# Altium footprint library My_PCB_6_28.PcbLib: 151 footprints (part 8 of 10)
Each footprint in its own frame and in the unit in brackets; x right, y up, seen from the top. Pads: shape width x height; smd on the part's side, far side on the other; paste and mask are expansions set on the pad; w line width, h text height; cw(c..) or ccw(c..) is an arc to the next point about the centre after c.
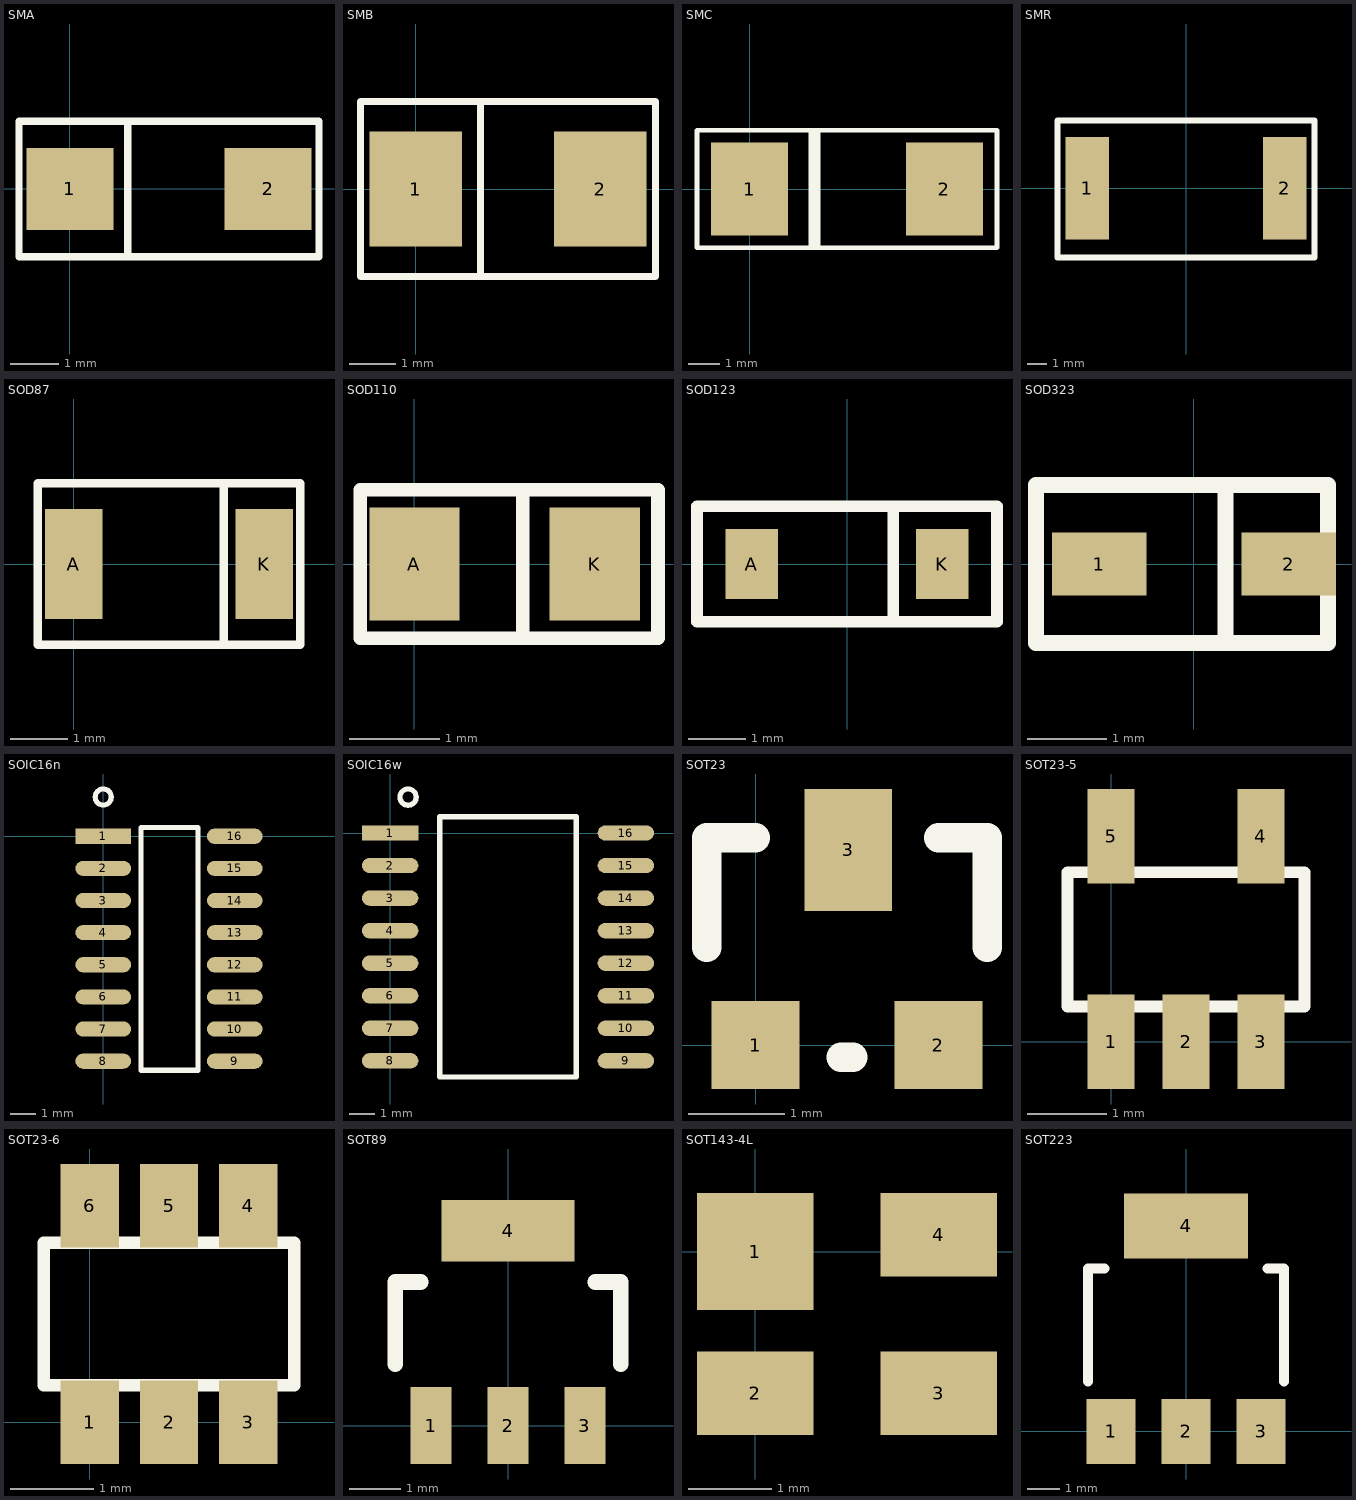
[diagram p7: the footprints below, top view; thin cyan lines are the x and y axes]

## SMA [mm]
height 7
pads (2):
  rect 1.8x1.7 smd: 1(0,0) 2(4.1,0)
Top Overlay:
  lines w0.15: 1.2,-1.4 1.2,1.4 ; -1.05,-1.4 5.15,-1.4 5.15,1.4 -1.05,1.4 -1.05,-1.4
3D body: height 1.85, standoff 0.01, extent -0.335,-0.902 4.46,0.902

## SMB [mm]
height 7
pads (2):
  rect 2x2.5 smd: 1(0,0) 2(4,0)
Top Overlay:
  lines w0.15: 1.4,-1.8 1.4,1.8 ; -1.2,-1.9 -1.2,1.9 5.2,1.9 5.2,-1.9 -1.2,-1.9
3D body: height 2.16, standoff 0.01, extent -0.492,-1.498 4.507,1.499

## SMC [mm]
height 7
pads (2):
  rect 2.5x3 smd: 1(0,0) 2(6.3,0)
Top Overlay:
  lines w0.15: -1.7,-1.9 -1.7,1.9 8,1.9 8,-1.9 -1.7,-1.9
  lines w0.2: 2,-1.85 2,1.85 ; 2.2,-1.85 2.2,1.85
3D body: height 2.84, standoff 0.01, extent -0.654,-1.756 6.943,1.756

## SMR [mm]
height 8
pads (2):
  rect 2.2x5.2 smd: 1(-5,0) 2(5,0)
Top Overlay:
  lines w0.305: -6.5,-3.5 6.5,-3.5 ; -6.5,-3.429 -6.5,3.429 6.5,3.429 ; 6.5,-3.43 6.5,3.43
3D body: height 3.96, standoff 0.01, extent -4.498,-2.3 4.498,2.353

## SOD87 [mm]
height 3
pads (2):
  rect 1x1.9 smd: A(0,0) K(3.3,0)
Top Overlay:
  lines w0.15: 2.6,-1.4 2.6,1.4 ; -0.625,-1.4 -0.625,1.4 3.925,1.4 3.925,-1.4 -0.625,-1.4

## SOD110 [mm]
height 4
pads (2):
  rect 1x1.25 smd: A(0,0) K(2,0)
Top Overlay:
  lines w0.15: 1.2,-0.825 1.2,0.825 ; -0.6,-0.825 2.7,-0.825 2.7,0.825 -0.6,0.825 -0.6,-0.825

## SOD123 [mm]
pads (2):
  rect 0.91x1.22 smd: A(-1.65,0) K(1.65,0)
Top Overlay:
  lines w0.2: 0.8,-1 0.8,1 ; -2.6,-1 2.6,-1 2.6,1 -2.6,1 -2.6,-1

## SOD323 [mm]
pads (2):
  rect 1.2x0.8 smd: 1(-1.2,0) 2(1.2,0)
Top Overlay:
  lines w0.2: 0.4,-1 0.4,1 ; -2,-1 1.7,-1 1.7,1 -2,1 -2,-1
3D body: height 0.75, standoff -0.01, extent -1.4,-0.675 1.4,0.675

## SOIC16n [mm]
pads (16):
  rect 2.2x0.6 smd: 1(0,0)
  oval 2.2x0.6 smd: 2(0,-1.27) 3(0,-2.54) 4(0,-3.81) 5(0,-5.08) 6(0,-6.35) 7(0,-7.62) 8(0,-8.89) 9(5.2,-8.89) 10(5.2,-7.62) 11(5.2,-6.35) 12(5.2,-5.08) 13(5.2,-3.81) 14(5.2,-2.54) 15(5.2,-1.27) 16(5.2,0)
Top Overlay:
  lines w0.2: 0.311,1.612 ccw(c0,1.55) 0.318,1.55 ; 1.5,-9.25 1.5,0.35 3.75,0.35 3.75,-9.25 1.5,-9.25
3D body: height 1.75, standoff 0, extent -0.35,-9.45 5.65,0.55

## SOIC16w [mm]
pads (16):
  rect 2.2x0.6 smd: 1(0,0)
  oval 2.2x0.6 smd: 2(0,-1.27) 3(0,-2.54) 4(0,-3.81) 5(0,-5.08) 6(0,-6.35) 7(0,-7.62) 8(0,-8.89) 9(9.2,-8.89) 10(9.2,-7.62) 11(9.2,-6.35) 12(9.2,-5.08) 13(9.2,-3.81) 14(9.2,-2.54) 15(9.2,-1.27) 16(9.2,0)
Top Overlay:
  lines w0.2: 1.011,1.462 ccw(c0.7,1.4) 1.018,1.4 ; 7.25,0.635 1.935,0.635 1.935,-9.525 7.265,-9.525 7.265,0.635
3D body: height 2.65, standoff 0, extent -0.55,-9.6 9.75,0.7

## SOT23 [mil] "SOT23"
pads (3):
  rect 36x36 smd: 1(0,0) 2(75,0)
  rect 36x50 smd: 3(38,80)
Top Overlay:
  lines w12: -20,40 -20,85 0,85 ; 35,-5 40,-5 ; 75,85 95,85 95,40
3D body: height 40.16, standoff 0, extent -18.11,-9.83 96.86,87.65

## SOT23-5 [mm]
pads (5):
  rect 0.6x1.2 smd: 1(0,0) 2(0.95,0) 3(1.9,0) 4(1.9,2.6) 5(0,2.6)
Top Overlay:
  lines w0.15: -0.55,0.445 -0.55,2.145 2.45,2.145 2.45,0.445 -0.55,0.445
3D body: height 1.1, standoff 0, extent -0.499,-0.2 2.4,2.6

## SOT23-6 [mm]
height 3
pads (6):
  rect 0.7x1 smd: 1(0,0) 2(0.95,0) 3(1.9,0) 4(1.9,2.59) 5(0.95,2.59) 6(0,2.59)
Top Overlay:
  lines w0.15: -0.55,0.445 2.45,0.445 2.45,2.145 -0.55,2.145 -0.55,0.445
3D body: height 1.09, standoff 0, extent -0.444,0.146 2.35,2.572

## SOT89 [mm]
height 1.6
pads (4):
  rect 0.8x1.5 smd: 1(-1.5,0) 2(0,0) 3(1.5,0)
  rect 2.6x1.2 smd: 4(0,3.8)
Top Overlay:
  lines w0.305: -2.2,1.2 -2.2,2.8 -1.7,2.8 ; 1.7,2.8 2.2,2.8 2.2,1.2
3D body: height 1.51, standoff 0, extent -2.25,-0.4 2.25,3.9

## SOT143-4L [mm]
pads (4):
  rect 1.4x1.4 smd: 1(0,0)
  rect 1.4x1 smd: 2(0,-1.7) 3(2.2,-1.7) 4(2.2,0.2)
3D body: height 1.07, standoff -0.03, extent -0.15,-2.25 2.35,0.75

## SOT223 [mm]
height 4
pads (4):
  rect 1.5x2 smd: 1(-2.3,0) 2(0,0) 3(2.3,0)
  rect 3.8x2 smd: 4(0,6.3)
Top Overlay:
  lines w0.305: -3,1.524 -3,5 -2.5,5 ; 2.5,5 3,5 3,1.524
3D body: height 1.69, standoff 0.04, extent -3.25,-0.6 3.25,6.4